# Altium footprint library standard.PcbLib: 330 footprints (part 16 of 21)
Each footprint in its own frame and in the unit in brackets; x right, y up, seen from the top. Pads: shape width x height; smd on the part's side, far side on the other; paste and mask are expansions set on the pad; w line width, h text height; cw(c..) or ccw(c..) is an arc to the next point about the centre after c.
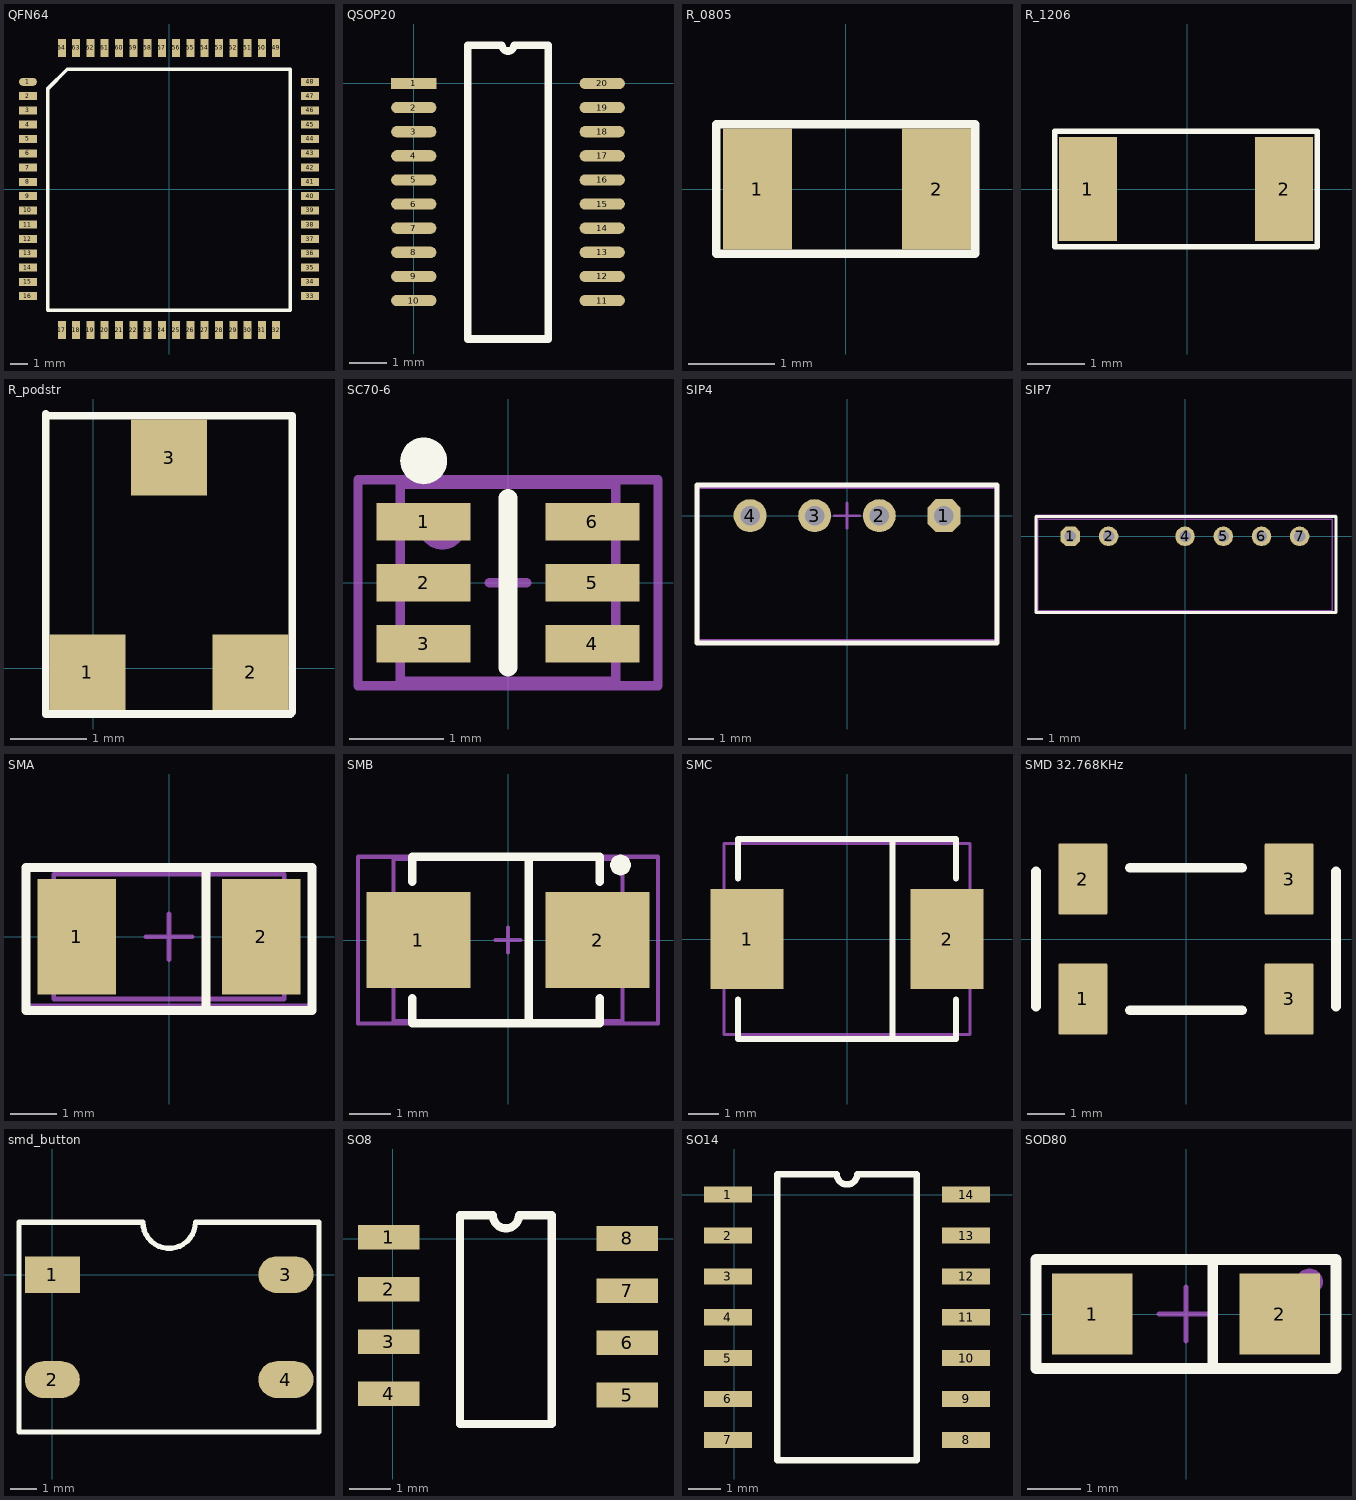
[diagram p15: the footprints below, top view; thin cyan lines are the x and y axes]

## QFN64 [mm]
pads (64):
  oval 1x0.45 smd: 1(-7.9,6)
  rect 1x0.45 smd: 2(-7.9,5.2) 3(-7.9,4.4) 4(-7.9,3.6) 5(-7.9,2.8) 6(-7.9,2) 7(-7.9,1.2) 8(-7.9,0.4) 9(-7.9,-0.4) 10(-7.9,-1.2) 11(-7.9,-2) 12(-7.9,-2.8) 13(-7.9,-3.6) 14(-7.9,-4.4) 15(-7.9,-5.2) 16(-7.9,-6) 33(7.9,-6) 34(7.9,-5.2) 35(7.9,-4.4) 36(7.9,-3.6) 37(7.9,-2.8) 38(7.9,-2) 39(7.9,-1.2) 40(7.9,-0.4) 41(7.9,0.4) 42(7.9,1.2) 43(7.9,2) 44(7.9,2.8) 45(7.9,3.6) 46(7.9,4.4) 47(7.9,5.2) 48(7.9,6)
  rect 0.45x1 smd: 17(-6,-7.9) 18(-5.2,-7.9) 19(-4.4,-7.9) 20(-3.6,-7.9) 21(-2.8,-7.9) 22(-2,-7.9) 23(-1.2,-7.9) 24(-0.4,-7.9) 25(0.4,-7.9) 26(1.2,-7.9) 27(2,-7.9) 28(2.8,-7.9) 29(3.6,-7.9) 30(4.4,-7.9) 31(5.2,-7.9) 32(6,-7.9) 49(6,7.9) 50(5.2,7.9) 51(4.4,7.9) 52(3.6,7.9) 53(2.8,7.9) 54(2,7.9) 55(1.2,7.9) 56(0.4,7.9) 57(-0.4,7.9) 58(-1.2,7.9) 59(-2,7.9) 60(-2.8,7.9) 61(-3.6,7.9) 62(-4.4,7.9) 63(-5.2,7.9) 64(-6,7.9)
Top Overlay:
  lines w0.2: -6.8,-6.8 -6.8,5.6 -5.7,6.7 6.8,6.7 6.8,-6.8 -6.8,-6.8
3D body "AtMega128.stp": height 1.2, standoff -0.13, extent -8.1,-8.1 8.1,8.1

## QSOP20 [mm]
pads (20):
  rect 1.2x0.3 smd: 1(0,0)
  oval 1.2x0.3 smd: 2(0,-0.64) 3(0,-1.28) 4(0,-1.92) 5(0,-2.56) 6(0,-3.2) 7(0,-3.84) 8(0,-4.48) 9(0,-5.12) 10(0,-5.76) 11(5,-5.76) 12(5,-5.12) 13(5,-4.48) 14(5,-3.84) 15(5,-3.2) 16(5,-2.56) 17(5,-1.92) 18(5,-1.28) 19(5,-0.64) 20(5,0)
Top Overlay:
  lines w0.2: 1.435,-6.78 1.435,1.02 2.34,1.02 ccw(c2.5,1.02) 2.66,1.02 3.565,1.02 3.565,-6.78 1.435,-6.78
3D body "User Library-QSOP20.STEP": height 1.73, standoff 0, extent -0.695,-7.27 5.495,1.47

## R_0805 [mm]
pads (2):
  rect 0.8x1.4 smd: 1(-1.025,0) 2(1.05,0)
Top Overlay:
  lines w0.1: -1.5,-0.75 1.5,-0.75 1.5,0.75 0.5,0.75 -0.5,0.75 -1.5,0.75 -1.5,0.3 -1.5,-0.75
3D body "User Library-RES_2013-0805.step": height 0.76, standoff 0, extent -1.125,-0.625 1.175,0.725
3D body "Р1-12-0.125.stp": height 0.33, standoff -0.03, extent -1.1,-0.65 1.1,0.6

## R_1206 [mm]
pads (2):
  rect 1x1.8 smd: 1(-1.725,0) 2(1.675,0)
Top Overlay:
  lines w0.1: -2.3,-1 -2.3,0.2 -2.3,1 2.25,1 2.25,-1 -2.3,-1
3D body "User Library-RES_3216-1206.step": height 0.85, standoff 0, extent -1.675,-0.84 1.675,0.89

## R_podstr [mm]
pads (3):
  rect 1x1 smd paste+0 mask+0: 1(-0.075,-0.05) 2(2.075,-0.05) 3(1,2.775)
Top Overlay:
  lines w0.1: -0.625,-0.6 2.6,-0.6 2.625,-0.575 2.625,3.325 -0.6,3.325 -0.625,3.35 -0.625,-0.6

## SC70-6 [mm] "SOT23, 5-Leads, Body 2,90x2,80mm, Pitch 0,95mm, IPC Medium Density"
height 1.45
pads (8):
  rect 1x0.4 smd: 1(-0.9,0.65) 2(-0.9,0) 3(-0.9,-0.65) 4(0.9,-0.65) 5(0.9,0) 6(0.9,0.65)
  round 0.5 on Top Overlay: ""(-0.9,1.3)
  round 0.5 on Mech1: ""(-0.7,0.6)
Top Overlay:
  lines w0.2: 0,-0.9 0,0.9
Mechanical 1:
  lines w0.1: -1.15,-1.05 1.15,-1.05 1.15,1.05 -1.15,1.05 -1.15,-1.05
Mechanical 15:
  lines w0.1: -0.2,0 0.2,0 ; 0,-0.2 0,0.2 ; -1.6,-1.1 -1.6,1.1 1.6,1.1 1.6,-1.1 -1.6,-1.1
3D body "User Library-sot363.STEP": height 1, standoff 0, extent -1.15,-1.05 1.15,1.05

## SIP4 [mm]
height 15
pads (4):
  oct 1.3x1.3 hole 0.762: 1(3.81,0)
  round 1.3 hole 0.762: 2(1.27,0) 3(-1.27,0) 4(-3.81,0)
Top Overlay:
  lines w0.2: -5.9,-5 5.9,-5 5.9,1.2 -5.9,1.2 -5.9,-5
Mechanical 1:
  lines w0.1: -5.842,-4.9 5.842,-4.9 5.842,1.1 -5.842,1.1 -5.842,-4.9
Mechanical 15:
  lines w0.1: -0.5,0 0.5,0 ; 0,-0.5 0,0.5 ; -5.9,-5 -5.9,1.2 5.9,1.2 5.9,-5 -5.9,-5
3D body "P6AU.STEP": height 10, standoff -3, extent -5.84,-4.905 5.84,1.095

## SIP7 [mm]
height 15
pads (6):
  oct 1.3x1.3 hole 0.762: 1(-7.62,0)
  round 1.3 hole 0.762: 2(-5.08,0) 4(0,0) 5(2.54,0) 6(5.08,0) 7(7.62,0)
Top Overlay:
  lines w0.2: -9.906,-5.08 10.033,-5.08 10.033,1.3 -9.906,1.3 -9.906,-5.08
Mechanical 1:
  lines w0.1: -9.779,-4.953 9.779,-4.953 9.779,1.143 -9.779,1.143 -9.779,-4.953
Mechanical 15:
  lines w0.1: -0.5,0 0.5,0 ; 0,-0.5 0,0.5 ; -9.906,-5.08 -9.906,1.397 10.033,1.397 10.033,-5.08 -9.906,-5.08
3D body "SIP-7(124567).STEP": height 10, standoff -2.5, extent -9.72,-4.9 9.78,1.15

## SMA [mm]
pads (3):
  rect 1.7x2.5 smd: 1(-2,0) 2(2,0)
  round 0.5 on Mech1: ""(2,0.9)
Top Overlay:
  lines w0.2: 0.8,-1.6 0.8,1.5 ; -3.1,-1.6 -3.1,1.5 3.1,1.5 3.1,-1.6 -3.1,-1.6
Mechanical 1:
  lines w0.1: -2.5,-1.35 -2.5,1.35 2.5,1.35 2.5,-1.35 -2.5,-1.35
Mechanical 15:
  lines w0.1: -0.5,0 0.5,0 ; 0,-0.5 0,0.5 ; -3.1,-1.5 3.1,-1.5 3.1,1.5 -3.1,1.5 -3.1,-1.5
3D body "User Library-Diode Molded BodyDIOM5025X231N.STEP": height 2.28, standoff -0.03, extent -2.5,-1.35 2.5,1.35

## SMB [mm]
pads (3):
  rect 2.5x2.3 smd: 1(-2.15,0) 2(2.15,0)
  round 0.5 on Top Overlay: ""(2.7,1.8)
Top Overlay:
  lines w0.2: -2.3,-1.4 -2.3,-2 2.2,-2 2.2,-1.4 ; -2.3,1.4 -2.3,2 2.2,2 2.2,1.4 ; 0.5,-2 0.5,2
Mechanical 1:
  lines w0.1: 0.5,-1.95 0.5,1.95 ; -2.75,-1.95 -2.75,1.95 2.75,1.95 2.75,-1.95 -2.75,-1.95
Mechanical 15:
  lines w0.1: -0.3,0 0.3,0 ; 0,-0.3 0,0.3 ; -3.6,-2 3.6,-2 3.6,2 -3.6,2 -3.6,-2
3D body "User Library-DIOM5539X24.STEP": height 2.45, standoff 0.03, extent -2.75,-1.95 2.75,1.95

## SMC [mm]
pads (2):
  rect 2.4x3.3 smd: 1(-3.3,0) 2(3.3,0)
Top Overlay:
  lines w0.2: -3.6,-2 -3.6,-3.3 3.6,-3.3 3.6,-2 ; -3.6,2 -3.6,3.3 3.6,3.3 3.6,2 ; 1.5,-3.3 1.5,3.3
Mechanical 1:
  lines w0.1: 1.5,-3.15 1.5,3.15 ; -4.064,-3.15 -4.064,3.15 4.064,3.15 4.064,-3.15 -4.064,-3.15
3D body "User Library-DO-214AB(SMC).STEP": height 2.67, standoff 0.03, extent -4.064,-3.15 4.064,3.15

## SMD 32.768KHz [mm]
pads (4):
  rrect5% 1.3x1.9 smd: 1(-2.75,-1.6) 2(-2.75,1.6) 3(2.75,-1.6) 3(2.75,1.6)
Top Overlay:
  lines w0.254: -4,-1.8 -4,1.8 ; -1.5,-1.9 1.5,-1.9 ; -1.5,1.9 1.5,1.9 ; 4,-1.8 4,1.8
3D body "Кварцевый резонатор SMD 32,768KHz.x_t": height 2.5, standoff 0, extent -4,-1.9 4,1.9

## smd_button [mm]
pads (4):
  rect 2.1x1.4 smd: 1(0,0)
  oval 2.1x1.4 smd: 2(0,-4) 3(8.9,0) 4(8.9,-4)
Top Overlay:
  lines w0.2: -1.27,-6 10.16,-6 10.16,2 5.45,2 cw(c4.45,2) 3.45,2 -1.27,2 -1.27,-6

## SO8 [mm]
pads (8):
  rect 1.5x0.6 smd: 1(-0.1,0.04) 2(-0.1,-1.23) 3(-0.1,-2.5) 4(-0.1,-3.77) 5(5.7,-3.8) 6(5.7,-2.53) 7(5.7,-1.26) 8(5.7,0.01)
Top Overlay:
  lines w0.2: 1.635,-4.505 1.635,0.575 2.432,0.575 ccw(c2.75,0.575) 3.067,0.575 3.865,0.575 3.865,-4.505 1.635,-4.505
3D body "User Library-SOIC-8-1.step": height 1.75, standoff 0, extent -0.3,-4.35 5.7,0.55

## SO14 [mm]
pads (14):
  rect 1.5x0.5 smd: 1(-0.2,0) 2(-0.2,-1.27) 3(-0.2,-2.54) 4(-0.2,-3.81) 5(-0.2,-5.08) 6(-0.2,-6.35) 7(-0.2,-7.62) 8(7.2,-7.62) 9(7.2,-6.35) 10(7.2,-5.08) 11(7.2,-3.81) 12(7.2,-2.54) 13(7.2,-1.27) 14(7.2,0)
Top Overlay:
  lines w0.2: 1.335,-8.255 5.665,-8.255 5.665,0.635 3.818,0.635 cw(c3.5,0.635) 3.183,0.635 1.335,0.635 1.335,-8.255

## SOD80 [mm]
height 2
pads (3):
  rect 1.5x1.5 smd: 1(-1.75,0) 2(1.75,0)
  round 0.5 on Mech1: ""(2.3,0.6)
Top Overlay:
  lines w0.2: 0.5,-1.016 0.5,1 ; -2.794,-1.016 -2.794,1.016 2.794,1.016 2.794,-1.016 -2.794,-1.016
Mechanical 1:
  lines w0.1: 0.5,-1.016 0.5,1.016 ; -2.794,-1.016 -2.794,1.016 2.794,1.016 2.794,-1.016 -2.794,-1.016
Mechanical 15:
  lines w0.1: -0.5,0 0.5,0 ; 0,-0.5 0,0.5 ; -2.794,-1.016 2.794,-1.016 2.794,1.016 -2.794,1.016 -2.794,-1.016
3D body "SOD80-2.step": height 1.52, standoff -0.02, extent -1.676,-0.777 1.677,0.762